# Altium footprint library General_Lib.PcbLib: 729 footprints (part 28 of 46)
Each footprint in its own frame and in the unit in brackets; x right, y up, seen from the top. Pads: shape width x height; smd on the part's side, far side on the other; paste and mask are expansions set on the pad; w line width, h text height; cw(c..) or ccw(c..) is an arc to the next point about the centre after c.
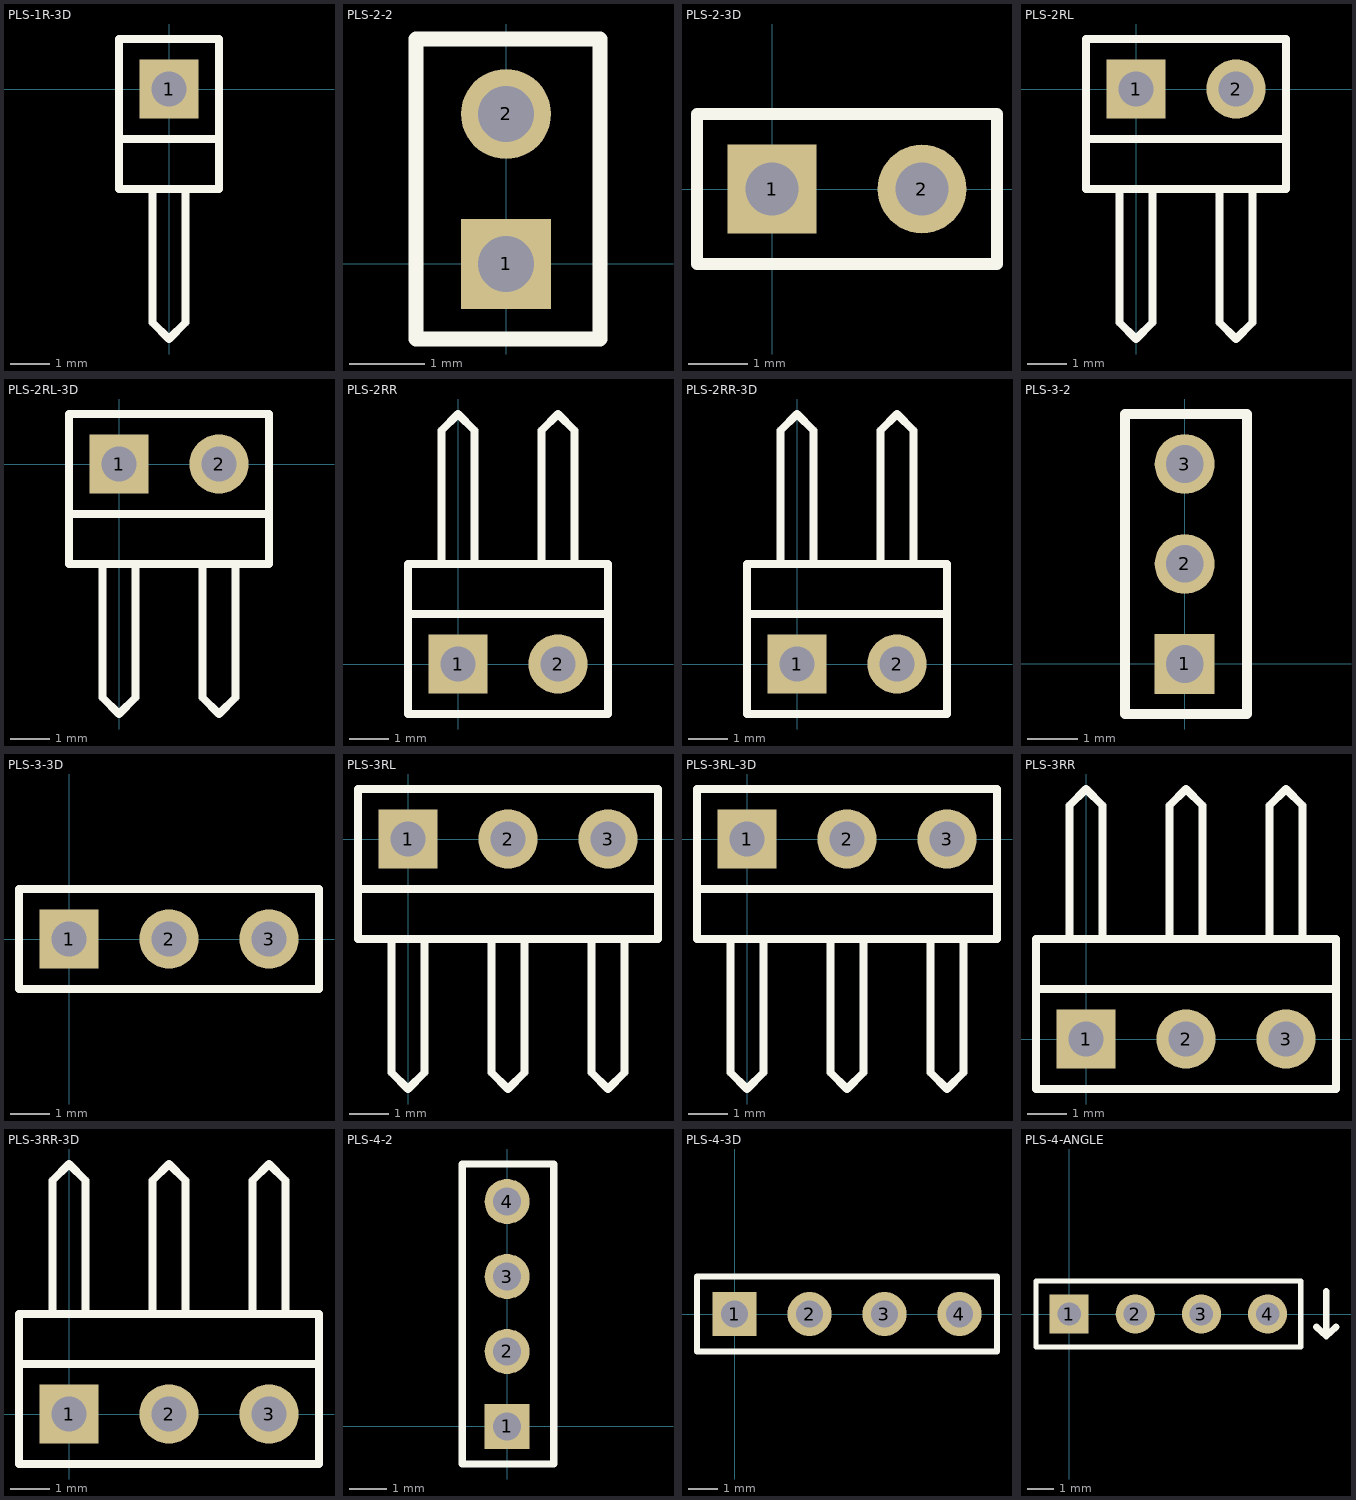
[diagram p27: the footprints below, top view; thin cyan lines are the x and y axes]

## PLS-1R-3D [mm] "Connector; Header; 1 Position; Right Angle"
height 12
pads (1):
  rect 1.5x1.5 hole 0.9: 1(0,0)
Top Overlay:
  lines w0.2: -0.423,-2.54 -0.423,-5.927 0,-6.35 0.423,-5.927 0.423,-2.54 ; -1.27,-1.27 -1.27,1.27 1.27,1.27 1.27,-1.27 ; -1.27,-1.27 -1.27,-2.54 1.27,-2.54 1.27,-1.27 ; -1.27,-1.27 1.27,-1.27
3D body "PLS-1R.step": height 5.45, standoff -3, extent -1.27,-7.35 1.27,1.27

## PLS-2-2 [mm] "Connector; Header; 1x2 Position"
height 6
pads (2):
  rect 1.2x1.2 hole 0.75: 1(0,0)
  round 1.2 hole 0.75: 2(0,2)
Top Overlay:
  lines w0.2: -1.2,-1 1.25,-1 1.25,3 -1.2,3 -1.2,-1
3D body "pls-2mm.stp": height 5.5, standoff -2.5, extent -1.2,1 1.2,3
3D body "pls-2mm.stp": height 5.5, standoff -2.5, extent -1.2,-1 1.2,1

## PLS-2-3D [mm] "Connector; Header; 2 Position"
height 7.5
pads (2):
  rect 1.5x1.5 hole 0.9: 1(0,0)
  round 1.5 hole 0.9: 2(2.54,0)
Top Overlay:
  lines w0.2: -1.27,-1.27 3.81,-1.27 3.81,1.27 -1.27,1.27 -1.27,-1.27
3D body "PLS-1.step": height 8.44, standoff -3, extent -1.27,-1.27 1.27,1.27
3D body "PLS-1.step": height 8.44, standoff -3, extent 1.27,-1.27 3.81,1.27

## PLS-2RL [mm] "Connector; Header; 2 Position; Right Angle"
pads (2):
  rect 1.5x1.5 hole 0.9: 1(0,0)
  round 1.5 hole 0.9: 2(2.54,0)
Top Overlay:
  lines w0.2: -0.423,-2.54 -0.423,-5.927 0,-6.35 0.423,-5.927 0.423,-2.54 ; 2.117,-2.54 2.117,-5.927 2.54,-6.35 2.963,-5.927 2.963,-2.54 ; 3.81,-1.27 -1.27,-1.27 ; -1.27,-2.54 -1.27,1.27 ; -1.27,-2.54 3.81,-2.54 3.81,1.27 -1.27,1.27 ; -1.27,-2.54 -1.27,-1.27 ; -1.27,-1.27 -1.27,1.27

## PLS-2RL-3D [mm] "Connector; Header; 2 Position; Right Angle"
height 12
pads (2):
  rect 1.5x1.5 hole 0.9: 1(0,0)
  round 1.5 hole 0.9: 2(2.54,0)
Top Overlay:
  lines w0.2: -0.423,-2.54 -0.423,-5.927 0,-6.35 0.423,-5.927 0.423,-2.54 ; 2.117,-2.54 2.117,-5.927 2.54,-6.35 2.963,-5.927 2.963,-2.54 ; 3.81,-1.27 -1.27,-1.27 ; -1.27,-2.54 -1.27,-1.27 ; -1.27,-2.54 3.81,-2.54 3.81,1.27 -1.27,1.27 ; -1.27,-2.54 -1.27,1.27 ; -1.27,-1.27 -1.27,1.27
3D body "PLS-1R.step": height 5.45, standoff -3, extent 1.27,-7.35 3.81,1.27
3D body "PLS-1R.step": height 5.45, standoff -3, extent -1.27,-7.35 1.27,1.27

## PLS-2RR [mm] "Connector; Header; 2 Position; Right Angle"
height 12
pads (2):
  rect 1.5x1.5 hole 0.9: 1(0,0)
  round 1.5 hole 0.9: 2(2.54,0)
Top Overlay:
  lines w0.2: -1.27,1.27 3.81,1.27 ; -0.423,2.54 -0.423,5.927 0,6.35 0.423,5.927 0.423,2.54 ; 2.117,2.54 2.117,5.927 2.54,6.35 2.963,5.927 2.963,2.54 ; -1.27,-1.27 -1.27,2.54 3.81,2.54 3.81,-1.27 -1.27,-1.27

## PLS-2RR-3D [mm] "Connector; Header; 2 Position; Right Angle"
height 12
pads (2):
  rect 1.5x1.5 hole 0.9: 1(0,0)
  round 1.5 hole 0.9: 2(2.54,0)
Top Overlay:
  lines w0.2: -1.27,1.27 3.81,1.27 ; -0.423,2.54 -0.423,5.927 0,6.35 0.423,5.927 0.423,2.54 ; 2.117,2.54 2.117,5.927 2.54,6.35 2.963,5.927 2.963,2.54 ; -1.27,-1.27 3.81,-1.27 3.81,2.54 -1.27,2.54 -1.27,-1.27
3D body "PLS-1R.step": height 5.45, standoff -3, extent 1.27,-1.27 3.81,7.35
3D body "PLS-1R.step": height 5.45, standoff -3, extent -1.27,-1.27 1.27,7.35

## PLS-3-2 [mm] "Connector; Header; 1x3 Position"
height 6
pads (3):
  rect 1.2x1.2 hole 0.75: 1(0,0)
  round 1.2 hole 0.75: 2(0,2) 3(0,4)
Top Overlay:
  lines w0.2: -1.2,-1 1.25,-1 1.25,5 -1.2,5 -1.2,-1
3D body "pls-2mm.stp": height 5.5, standoff -2.5, extent -1.2,3 1.2,5
3D body "pls-2mm.stp": height 5.5, standoff -2.5, extent -1.2,1 1.2,3
3D body "pls-2mm.stp": height 5.5, standoff -2.5, extent -1.2,-1 1.2,1

## PLS-3-3D [mm] "Connector; Header; 3 Position"
height 7.5
pads (3):
  rect 1.5x1.5 hole 0.9: 1(0,0)
  round 1.5 hole 0.9: 2(2.54,0) 3(5.08,0)
Top Overlay:
  lines w0.2: -1.27,-1.27 -1.27,1.27 6.35,1.27 6.35,-1.27 -1.27,-1.27
3D body "PLS-1.step": height 8.44, standoff -3, extent 3.81,-1.27 6.35,1.27
3D body "PLS-1.step": height 8.44, standoff -3, extent 1.27,-1.27 3.81,1.27
3D body "PLS-1.step": height 8.44, standoff -3, extent -1.27,-1.27 1.27,1.27

## PLS-3RL [mm] "Connector; Header; 3 Position; Right Angle"
height 12
pads (3):
  rect 1.5x1.5 hole 0.9: 1(0,0)
  round 1.5 hole 0.9: 2(2.54,0) 3(5.08,0)
Top Overlay:
  lines w0.2: -0.423,-2.54 -0.423,-5.927 0,-6.35 0.423,-5.927 0.423,-2.54 ; 2.117,-2.54 2.117,-5.927 2.54,-6.35 2.963,-5.927 2.963,-2.54 ; 4.657,-2.54 4.657,-5.927 5.08,-6.35 5.503,-5.927 5.503,-2.54 ; 6.35,-1.27 -1.27,-1.27 ; -1.27,-2.54 -1.27,1.27 ; -1.27,-2.54 6.35,-2.54 6.35,1.27 -1.27,1.27 ; -1.27,-2.54 -1.27,-1.27 ; -1.27,-1.27 -1.27,1.27

## PLS-3RL-3D [mm] "Connector; Header; 3 Position; Right Angle"
height 12
pads (3):
  rect 1.5x1.5 hole 0.9: 1(0,0)
  round 1.5 hole 0.9: 2(2.54,0) 3(5.08,0)
Top Overlay:
  lines w0.2: -0.423,-2.54 -0.423,-5.927 0,-6.35 0.423,-5.927 0.423,-2.54 ; 2.117,-2.54 2.117,-5.927 2.54,-6.35 2.963,-5.927 2.963,-2.54 ; 4.657,-2.54 4.657,-5.927 5.08,-6.35 5.503,-5.927 5.503,-2.54 ; 6.35,-1.27 -1.27,-1.27 ; -1.27,-2.54 -1.27,1.27 ; -1.27,-2.54 6.35,-2.54 6.35,1.27 -1.27,1.27 ; -1.27,-2.54 -1.27,-1.27 ; -1.27,-1.27 -1.27,1.27
3D body "PLS-1R.step": height 5.45, standoff -3, extent 3.81,-7.35 6.35,1.27
3D body "PLS-1R.step": height 5.45, standoff -3, extent 1.27,-7.35 3.81,1.27
3D body "PLS-1R.step": height 5.45, standoff -3, extent -1.27,-7.35 1.27,1.27

## PLS-3RR [mm] "Connector; Header; 3 Position; Right Angle"
height 12
pads (3):
  rect 1.5x1.5 hole 0.9: 1(0,0)
  round 1.5 hole 0.9: 2(2.54,0) 3(5.08,0)
Top Overlay:
  lines w0.2: -1.27,1.27 6.35,1.27 ; -0.423,2.54 -0.423,5.927 0,6.35 0.423,5.927 0.423,2.54 ; 2.117,2.54 2.117,5.927 2.54,6.35 2.963,5.927 2.963,2.54 ; 4.657,2.54 4.657,5.927 5.08,6.35 5.503,5.927 5.503,2.54 ; -1.27,-1.27 -1.27,2.54 6.35,2.54 6.35,-1.27 -1.27,-1.27

## PLS-3RR-3D [mm] "Connector; Header; 3 Position; Right Angle"
height 12
pads (3):
  rect 1.5x1.5 hole 0.9: 1(0,0)
  round 1.5 hole 0.9: 2(2.54,0) 3(5.08,0)
Top Overlay:
  lines w0.2: -1.27,1.27 6.35,1.27 ; -0.423,2.54 -0.423,5.927 0,6.35 0.423,5.927 0.423,2.54 ; 2.117,2.54 2.117,5.927 2.54,6.35 2.963,5.927 2.963,2.54 ; 4.657,2.54 4.657,5.927 5.08,6.35 5.503,5.927 5.503,2.54 ; -1.27,-1.27 6.35,-1.27 6.35,2.54 -1.27,2.54 -1.27,-1.27
3D body "PLS-1R.step": height 5.45, standoff -3, extent -1.27,-1.27 1.27,7.35
3D body "PLS-1R.step": height 5.45, standoff -3, extent 1.27,-1.27 3.81,7.35
3D body "PLS-1R.step": height 5.45, standoff -3, extent 3.81,-1.27 6.35,7.35

## PLS-4-2 [mm] "Connector; Header; 1x4 Position"
height 6
pads (4):
  rect 1.2x1.2 hole 0.75: 1(0,0)
  round 1.2 hole 0.75: 2(0,2) 3(0,4) 4(0,6)
Top Overlay:
  lines w0.2: -1.2,-1 1.25,-1 1.25,7 -1.2,7 -1.2,-1
3D body "pls-2mm.stp": height 5.5, standoff -2.5, extent -1.2,5 1.2,7
3D body "pls-2mm.stp": height 5.5, standoff -2.5, extent -1.2,3 1.2,5
3D body "pls-2mm.stp": height 5.5, standoff -2.5, extent -1.2,1 1.2,3
3D body "pls-2mm.stp": height 5.5, standoff -2.5, extent -1.2,-1 1.2,1

## PLS-4-3D [mm] "Connector; Header; 4 Position"
height 7.5
pads (4):
  rect 1.5x1.5 hole 0.9: 1(0,0)
  round 1.5 hole 0.9: 2(2.54,0) 3(5.08,0) 4(7.62,0)
Top Overlay:
  lines w0.2: -1.27,-1.27 -1.27,1.27 8.89,1.27 8.89,-1.27 -1.27,-1.27
3D body "PLS-1.step": height 8.44, standoff -3, extent -1.27,-1.27 1.27,1.27
3D body "PLS-1.step": height 8.44, standoff -3, extent 1.27,-1.27 3.81,1.27
3D body "PLS-1.step": height 8.44, standoff -3, extent 3.81,-1.27 6.35,1.27
3D body "PLS-1.step": height 8.44, standoff -3, extent 6.35,-1.27 8.89,1.27

## PLS-4-ANGLE [mm] "Connector; Header; 4 Position; Right Angle"
height 12
pads (4):
  rect 1.5x1.5 hole 0.9: 1(0,0)
  round 1.5 hole 0.9: 2(2.54,0) 3(5.08,0) 4(7.62,0)
Top Overlay:
  lines w0.2: -1.27,-1.27 -1.27,1.27 8.89,1.27 8.89,-1.27 ; -1.27,-1.27 8.89,-1.27 ; -1.27,-1.27 8.89,-1.27
  lines w0.254: 9.495,-0.5 9.87,-0.85 ; 9.87,0.875 9.87,-0.85 ; 10.245,-0.5 9.87,-0.85
3D body "PLS-1R.step": height 5.45, standoff -3, extent 6.35,-7.35 8.89,1.27
3D body "PLS-1R.step": height 5.45, standoff -3, extent 3.81,-7.35 6.35,1.27
3D body "PLS-1R.step": height 5.45, standoff -3, extent 1.27,-7.35 3.81,1.27
3D body "PLS-1R.step": height 5.45, standoff -3, extent -1.27,-7.35 1.27,1.27